# Altium footprint library IDETEC.PcbLib: 275 footprints (part 5 of 18)
Each footprint in its own frame and in the unit in brackets; x right, y up, seen from the top. Pads: shape width x height; smd on the part's side, far side on the other; paste and mask are expansions set on the pad; w line width, h text height; cw(c..) or ccw(c..) is an arc to the next point about the centre after c.
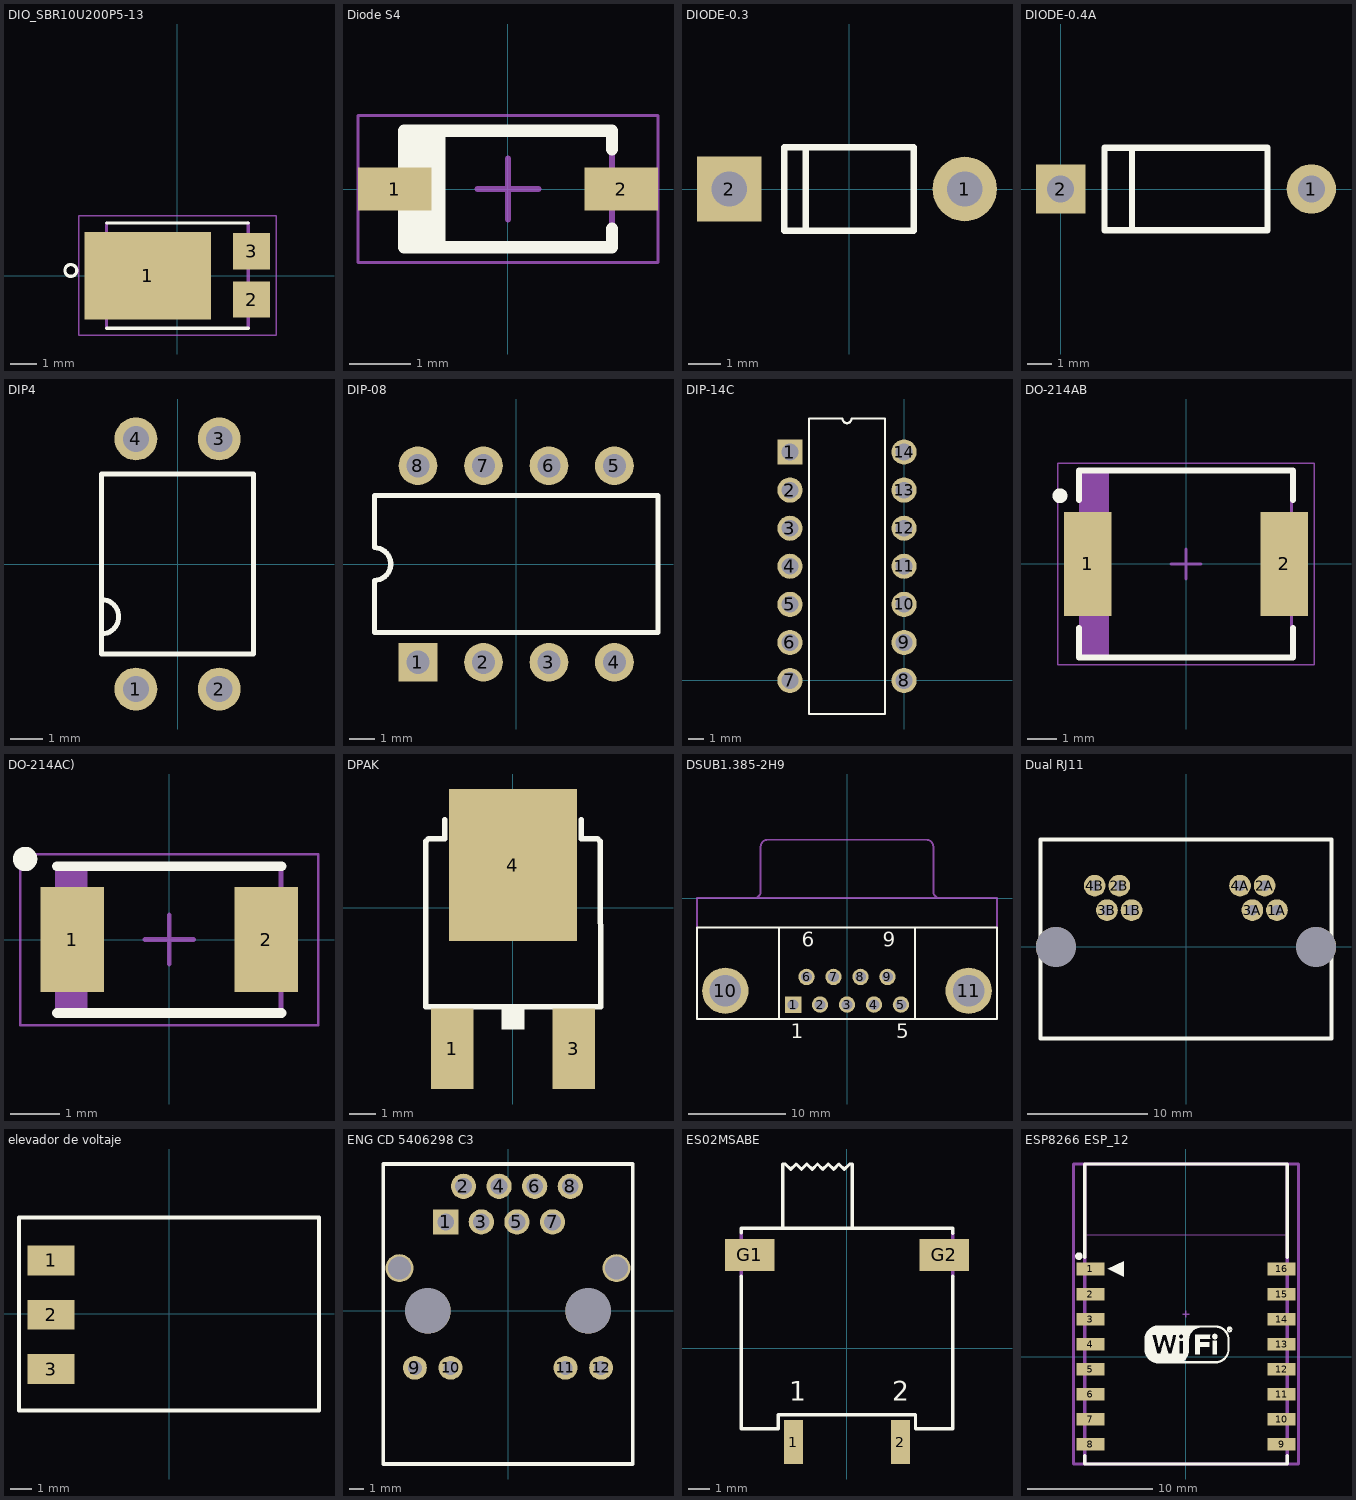
[diagram p4: the footprints below, top view; thin cyan lines are the x and y axes]

## DIO_SBR10U200P5-13 [mil]
pads (3):
  rect 192x133 smd: 1(-44.33,0)
  rect 56x55 smd: 2(113,-36.22) 3(113,37)
Top Overlay:
  circle w5: c-161.34,7.99 r9
  lines w5: -107.28,-79.72 108,-79.72 ; -107.28,80 108,80
Mechanical 16:
  lines w5: -107.28,-79.72 -107.28,80 ; 108,-79.72 108,80
Mechanical 27:
  lines w2: -149.61,-90.55 -149.61,91 150,91 150,-90.55 -149.61,-90.55
3D body "User Library-PowerDI-5.STEP": height 46.2, standoff 0.93, extent -130.19,-79.41 129.65,80.04

## Diode S4 [mm] "Molded Capacitor, 2-Leads, Body 3,20x1,60mm, IPC Medium Density"
height 1.8
pads (2):
  rect 1.2x0.7 smd: 1(-1.85,0) 2(1.85,0)
Top Overlay:
  lines w0.2: -1.7,-0.68 -1.7,0.95 1.7,0.95 1.7,0.65 ; -1.7,-0.65 -1.7,-0.95 1.7,-0.95 1.7,-0.65 ; -1.51,-0.94 -1.51,0.94 ; -1.32,-0.95 -1.32,0.95 ; -1.12,-0.95 -1.12,0.95
Mechanical 13:
  lines w0.1: -1.7,-0.9 1.7,-0.9 1.7,0.9 -1.7,0.9 -1.7,-0.9
Mechanical 15:
  lines w0.05: -2.45,-1.2 2.45,-1.2 2.45,1.2 -2.45,1.2 -2.45,-1.2
  lines w0.1: -0.5,0 0.5,0 ; 0,-0.5 0,0.5
3D body "User Library-SOD123.STEP": height 1.27, standoff 0, extent -1.85,-0.8 1.85,0.8

## DIODE-0.3 [mm] "DIODE-0.3"
pads (2):
  round 2 hole 1.1: 1(3.575,0)
  rect 2x2 hole 1.1: 2(-3.725,0)
Top Overlay:
  lines w0.2: -1.358,-1.3 -1.358,1.3 ; -2.02,-1.3 -2.015,0 -2.015,1.3 1.995,1.3 1.995,-1.3 -2.02,-1.3
3D body "User Library-Diode 1N4004 x7mm (pcb).STEP": height 1.9, standoff -3.31, extent -3.95,-1.31 3.85,1.31

## DIODE-0.4A [mm]
pads (2):
  round 2 hole 1.1: 1(10.16,0)
  rect 2x2 hole 1.1: 2(0,0)
Top Overlay:
  lines w0.25: 2.888,-1.662 2.888,1.661 ; 1.778,-1.67 8.382,-1.67 8.382,1.67 1.778,1.67 1.778,-1.67
3D body "User Library-DO-41-1.STEP": height 2.73, standoff -2.6, extent -0.412,-1.315 10.612,1.425

## DIP4 [mm]
pads (4):
  round 1.308 hole 0.8 mask-25.4: 1(-1.27,-3.81) 2(1.27,-3.81) 3(1.27,3.81) 4(-1.27,3.81)
Top Overlay:
  lines w0.152: -2.315,-2.13 ccw(c-2.315,-1.607) -2.315,-1.085 ; -2.315,-2.13 -2.315,-2.743 2.315,-2.743 2.315,2.743 -2.315,2.743 -2.315,-1.085 ; -2.315,-2.13 -2.315,-1.085
Top Solder:
  region: -1.27,-3.049 -1.467,-3.075 -1.65,-3.151 -1.808,-3.272 -1.929,-3.43 -2.005,-3.613 -2.031,-3.81 -2.005,-4.007 -1.929,-4.19 -1.808,-4.348 -1.65,-4.469 -1.467,-4.545 -1.27,-4.571 -1.073,-4.545 -0.89,-4.469 -0.732,-4.348 -0.611,-4.19 -0.535,-4.007 -0.509,-3.81 -0.535,-3.613 -0.611,-3.43 -0.732,-3.272 -0.89,-3.151 -1.073,-3.075
  region: 1.27,-3.049 1.073,-3.075 0.89,-3.151 0.732,-3.272 0.611,-3.43 0.535,-3.613 0.509,-3.81 0.535,-4.007 0.611,-4.19 0.732,-4.348 0.89,-4.469 1.073,-4.545 1.27,-4.571 1.467,-4.545 1.65,-4.469 1.808,-4.348 1.929,-4.19 2.005,-4.007 2.031,-3.81 2.005,-3.613 1.929,-3.43 1.808,-3.272 1.65,-3.151 1.467,-3.075
  region: 1.27,4.571 1.073,4.545 0.89,4.469 0.732,4.348 0.611,4.19 0.535,4.007 0.509,3.81 0.535,3.613 0.611,3.43 0.732,3.272 0.89,3.151 1.073,3.075 1.27,3.049 1.467,3.075 1.65,3.151 1.808,3.272 1.929,3.43 2.005,3.613 2.031,3.81 2.005,4.007 1.929,4.19 1.808,4.348 1.65,4.469 1.467,4.545
  region: -1.27,4.571 -1.467,4.545 -1.65,4.469 -1.808,4.348 -1.929,4.19 -2.005,4.007 -2.031,3.81 -2.005,3.613 -1.929,3.43 -1.808,3.272 -1.65,3.151 -1.467,3.075 -1.27,3.049 -1.073,3.075 -0.89,3.151 -0.732,3.272 -0.611,3.43 -0.535,3.613 -0.509,3.81 -0.535,4.007 -0.611,4.19 -0.732,4.348 -0.89,4.469 -1.073,4.545
Bottom Solder:
  region: -1.27,-3.049 -1.467,-3.075 -1.65,-3.151 -1.808,-3.272 -1.929,-3.43 -2.005,-3.613 -2.031,-3.81 -2.005,-4.007 -1.929,-4.19 -1.808,-4.348 -1.65,-4.469 -1.467,-4.545 -1.27,-4.571 -1.073,-4.545 -0.89,-4.469 -0.732,-4.348 -0.611,-4.19 -0.535,-4.007 -0.509,-3.81 -0.535,-3.613 -0.611,-3.43 -0.732,-3.272 -0.89,-3.151 -1.073,-3.075
  region: 1.27,-3.049 1.073,-3.075 0.89,-3.151 0.732,-3.272 0.611,-3.43 0.535,-3.613 0.509,-3.81 0.535,-4.007 0.611,-4.19 0.732,-4.348 0.89,-4.469 1.073,-4.545 1.27,-4.571 1.467,-4.545 1.65,-4.469 1.808,-4.348 1.929,-4.19 2.005,-4.007 2.031,-3.81 2.005,-3.613 1.929,-3.43 1.808,-3.272 1.65,-3.151 1.467,-3.075
  region: 1.27,4.571 1.073,4.545 0.89,4.469 0.732,4.348 0.611,4.19 0.535,4.007 0.509,3.81 0.535,3.613 0.611,3.43 0.732,3.272 0.89,3.151 1.073,3.075 1.27,3.049 1.467,3.075 1.65,3.151 1.808,3.272 1.929,3.43 2.005,3.613 2.031,3.81 2.005,4.007 1.929,4.19 1.808,4.348 1.65,4.469 1.467,4.545
  region: -1.27,4.571 -1.467,4.545 -1.65,4.469 -1.808,4.348 -1.929,4.19 -2.005,4.007 -2.031,3.81 -2.005,3.613 -1.929,3.43 -1.808,3.272 -1.65,3.151 -1.467,3.075 -1.27,3.049 -1.073,3.075 -0.89,3.151 -0.732,3.272 -0.611,3.43 -0.535,3.613 -0.509,3.81 -0.535,4.007 -0.611,4.19 -0.732,4.348 -0.89,4.469 -1.073,4.545
3D body "User Library-DIP4-7_62-2_54.STEP": height 4.3, standoff -2.7, extent -2.295,-3.94 2.295,3.94

## DIP-08 [mm] "DIP; 8 Leads; Row Spacing 7.62 mm; Pitch 2.54 mm"
height 5.08
pads (8):
  rect 1.5x1.5 hole 0.9: 1(-3.81,-3.81)
  round 1.5 hole 0.9: 2(-1.27,-3.81) 3(1.27,-3.81) 4(3.81,-3.81) 5(3.81,3.81) 6(1.27,3.81) 7(-1.27,3.81) 8(-3.81,3.81)
Top Overlay:
  lines w0.2: -5.5,-2.65 -5.5,-0.635 ccw(c-5.5,0) -5.5,0.635 -5.5,2.65 5.5,2.65 5.5,-2.65 -5.5,-2.65
3D body "User Library-PDIP-8.STEP": height 5.1, standoff -3.18, extent -5,-4.13 5,4.13

## DIP-14C [mil]
pads (14):
  rect 66x66 hole 44: 1(-300,600)
  round 66 hole 44: 2(-300,500) 3(-300,400) 4(-300,300) 5(-300,200) 6(-300,100) 7(-300,0) 8(0,0) 9(0,100) 10(0,200) 11(0,300) 12(0,400) 13(0,500) 14(0,600)
Top Overlay:
  lines w5.98: -162,688 ccw(c-150,688) -138,688
  lines w6: -162,688 -250,688 -250,-88 -50,-88 -50,688 -138,688
3D body "User Library-DIP-14P-M02.STEP": height 171.65, standoff -118.11, extent -300,-85.83 9.84,685.83

## DO-214AB [mm] "Molded Diode, 2-Leads, Body 6,85x5,90mm, IPC Medium Density"
height 2.34
pads (2):
  rect 1.6x3.5 smd: 1(-3.305,0) 2(3.305,0)
Top Overlay:
  circle w0.25: c-4.25,2.3 r0.125
  lines w0.2: -3.6,-2.15 -3.6,-3.15 3.6,-3.15 3.6,-2.15 ; -3.6,2.15 -3.6,3.15 3.6,3.15 3.6,2.15
Mechanical 13:
  rectangle: -3.555,-3.11 -2.599,3.11
  lines w0.1: -3.555,-3.11 3.555,-3.11 3.555,3.11 -3.555,3.11 -3.555,-3.11
Mechanical 15:
  lines w0.05: -4.325,-3.4 4.325,-3.4 4.325,3.4 -4.325,3.4 -4.325,-3.4
  lines w0.1: -0.5,0 0.5,0 ; 0,-0.5 0,0.5
3D body "User Library-DIOM8261X24.STEP": height 2.4, standoff 0.03, extent -4.065,-3.05 4.065,3.05

## DO-214AC) [mm] "Molded Diode, 2-Leads, Body 4,31x2,60mm, IPC Medium Density"
height 2.32
pads (2):
  rect 1.3x2.15 smd: 1(-1.99,0) 2(1.99,0)
Top Overlay:
  circle w0.25: c-2.95,1.65 r0.125
  lines w0.2: -2.3,-1.5 2.3,-1.5 ; -2.3,1.5 2.3,1.5
Mechanical 13:
  rectangle: -2.285,-1.46 -1.67,1.46
  lines w0.1: -2.285,-1.46 -2.285,1.46 2.285,1.46 2.285,-1.46 -2.285,-1.46
Mechanical 15:
  lines w0.05: -3.05,-1.75 -3.05,1.75 3.05,1.75 3.05,-1.75 -3.05,-1.75
  lines w0.1: -0.5,0 0.5,0 ; 0,-0.5 0,0.5
3D body "User Library-DIOM5528X26.STEP": height 2.6, standoff 0.03, extent -2.75,-1.4 2.75,1.4

## DPAK [mil] "DPAK"
pads (3):
  rect 63x119 smd: 1(-89.76,-209.06) 3(90,-209.06)
  rect 190x225 smd: 4(0,63)
Top Overlay:
  rectangle: -17,-180.81 17,-150.81
  lines w7.99: -129,98 -125,102 -101,102 ; 101,102 125,102 129,98
  lines w8: -129,98 -129.02,-146.81 130,-146.81 129,98 ; -101,102 -101,130 ; 101,102 101,130
Mechanical 16:
  lines w8: -83,148 83,148
3D body "User Library-DPAK_TO-252AA.STEP": height 93.31, standoff -1.18, extent -132.55,-240.07 132.56,157.56

## DSUB1.385-2H9 [mm] "Connector; D Subminiature; 9 Position; Right Angle; Pitch 1.385 mm"
height 12.75
pads (11):
  rect 1.69x1.69 hole 1.09: 1(-5.54,-10.92)
  round 1.69 hole 1.09: 2(-2.77,-10.92) 3(0,-10.92) 4(2.77,-10.92) 5(5.54,-10.92) 6(-4.155,-8.08) 7(-1.385,-8.08) 8(1.385,-8.08) 9(4.155,-8.08)
  round 4.76 hole 3.26: 10(-12.495,-9.5) 11(12.495,-9.5)
Top Overlay:
  lines w0.2: -7,-12.4 -7,-3 ; 7,-12.4 7,-3 ; -15.4,-12.4 -15.4,-3 15.4,-3 15.4,-12.4 -15.4,-12.4
  text "1" at -5.79,-14.375 h1.5
  text "5" at 5.04,-14.375 h1.5
  text "9" at 3.655,-4.975 h1.5
  text "6" at -4.655,-4.975 h1.5
Mechanical 1:
  lines w0.2: -15.4,-3.05 -15.4,0 15.4,0 15.4,-3.05 ; -9.56,0.005 ccw(c-9.56,0.7) -8.865,0.7 -8.865,5.3 ; -8.86,5.305 cw(c-8.165,5.305) -8.165,6 8.165,6 cw(c8.165,5.305) 8.86,5.305 ; 8.865,5.3 8.865,0.7 ccw(c9.56,0.7) 9.56,0.005
3D body "User Library-D-Sub-K122439102-Stig-Wahlstrom.STEP": height 13.01, standoff -3.29, extent -15.405,-13.175 15.405,6.025

## Dual RJ11 [mm] "CONN MOD JACK 6P6C R/A UNSHLD"
height 28
pads (10):
  round 1.8 hole 0.89 paste+0: 1A(7.545,3.05) 1B(-4.515,3.05) 2A(6.525,5.08) 2B(-5.535,5.08) 3A(5.505,3.05) 3B(-6.555,3.05) 4A(4.485,5.08) 4B(-7.575,5.08)
  round 3.3 hole 3.3: ""(-10.795,0) ""(10.795,0)
Top Overlay:
  lines w0.32: -12.065,-7.6 -12.065,8.91 12.065,8.91 12.065,-7.6 -12.065,-7.6
3D body "User Library-RJ11-WE-HOR-TAB-UP.STEP": height 14.5, standoff -3.5, extent -1.231,-5.575 13.169,7.425
3D body "User Library-RJ11-WE-HOR-TAB-UP.STEP": height 14.5, standoff -3.5, extent -13.187,-5.575 1.213,7.425

## elevador de voltaje [mm] "pólolu 9V step-up voltage"
pads (3):
  rect 2.2x1.4 smd: 1(-5.5,2.505) 2(-5.5,-0.035) 3(-5.5,-2.575)
Top Overlay:
  lines w0.2: -7,-4.5 -7,4.5 7,4.5 7,-4.5 -7,-4.5

## ENG CD 5406298 C3 [mm] "Conector Female RJ45"
height 2
pads (16):
  rect 1.8x1.8 hole 1.2: 1(-4.445,6.35)
  round 1.8 hole 1.2: 2(-3.175,8.89) 3(-1.905,6.35) 4(-0.635,8.89) 5(0.635,6.35) 6(1.905,8.89) 7(3.175,6.35) 8(4.445,8.89)
  round 1.7 hole 1: 9(-6.64,-4.06) 10(-4.1,-4.06) 11(4.1,-4.06) 12(6.64,-4.06)
  round 2 hole 1.63: ""(-7.745,3.05) ""(7.745,3.05)
  round 3.25 hole 3.25: ""(-5.715,0) ""(5.715,0)
Top Overlay:
  lines w0.254: -8.89,-10.92 -8.89,10.48 8.89,10.48 8.89,-10.92 -8.89,-10.92
3D body "SW3dPS-RJ45-8P-Pipe-Cat5e.STEP": height 3.1, standoff -15.05, extent -8.725,-10.225 8.875,13.775

## ES02MSABE [mil] "SWITCH SLIDE SPST 0.4VA 20V"
height 120.87
pads (4):
  rect 35x82 smd: 1(-100,-175) 2(100,-175)
  rect 92x60 smd: G1(-181.8,175) G2(182,175)
Top Overlay:
  lines w6: -197.5,135 -197.5,-150 -128.5,-150 -128.5,-124 128,-124 128,-150 198,-150 198,135 ; -197.5,216 -197.5,225 -120,225 ; 198,215 198,225 10,225 ; -120,225 -120,345 -115,345 -105,335 -95,345 -85,335 -75,345 -65,335 -55,345 -45,335 -35,345 -25,335 -15,345 -5,335 5,345 10,345 10,225 ; -120,225 10,225
  text "2" at 85,-110 h62
  text "1" at -107.5,-110 h62
Mechanical 16:
  lines w6: -197.5,135 -197.5,215 ; 198,135 198,215

## ESP8266 ESP_12 [mm] "ESP8266 ESP-12"
height 3.2
pads (16):
  rect 2.25x1 smd: 1(-7.625,7) 2(-7.625,5) 3(-7.625,3) 4(-7.625,1) 5(-7.625,-1) 6(-7.625,-3) 7(-7.625,-5) 8(-7.625,-7) 9(7.625,-7) 10(7.625,-5) 11(7.625,-3) 12(7.625,-1) 13(7.625,1) 14(7.625,3) 15(7.625,5) 16(7.625,7)
Top Overlay:
  drawing of 1268 lines, arcs and shapes, not listed
  text ".Designator" at -8.433,-9.398 h1
Mechanical 13:
  lines w0.051: -8.127,9.727 8.129,9.727 8.129,15.382 -8.127,15.382 -8.127,9.727
  lines w0.254: -8.084,-8.568 -8.084,15.371 8.084,15.371 8.084,-8.568 -8.084,-8.568
  text "ANTENNA AREA" at -7.873,14.874 h0.25
  text "CUTOUT POLYGON" at -7.873,14.366 h0.25
Mechanical 15:
  lines w0.1: -0.254,3.402 0.254,3.402 ; 0,3.148 0,3.656
  lines w0.254: -8.975,-8.568 8.975,-8.568 8.975,15.371 -8.975,15.371 -8.975,-8.568
3D body "ESP_12_ENew.STEP": height 3.82, standoff -0.05, extent -7.859,-8.522 8.156,15.509